# Altium footprint library WR-TBL_Pluggable PCB Header.PcbLib: 719 footprints (part 21 of 45)
Each footprint in its own frame and in the unit in brackets; x right, y up, seen from the top. Pads: shape width x height; smd on the part's side, far side on the other; paste and mask are expansions set on the pad; w line width, h text height; cw(c..) or ccw(c..) is an arc to the next point about the centre after c.
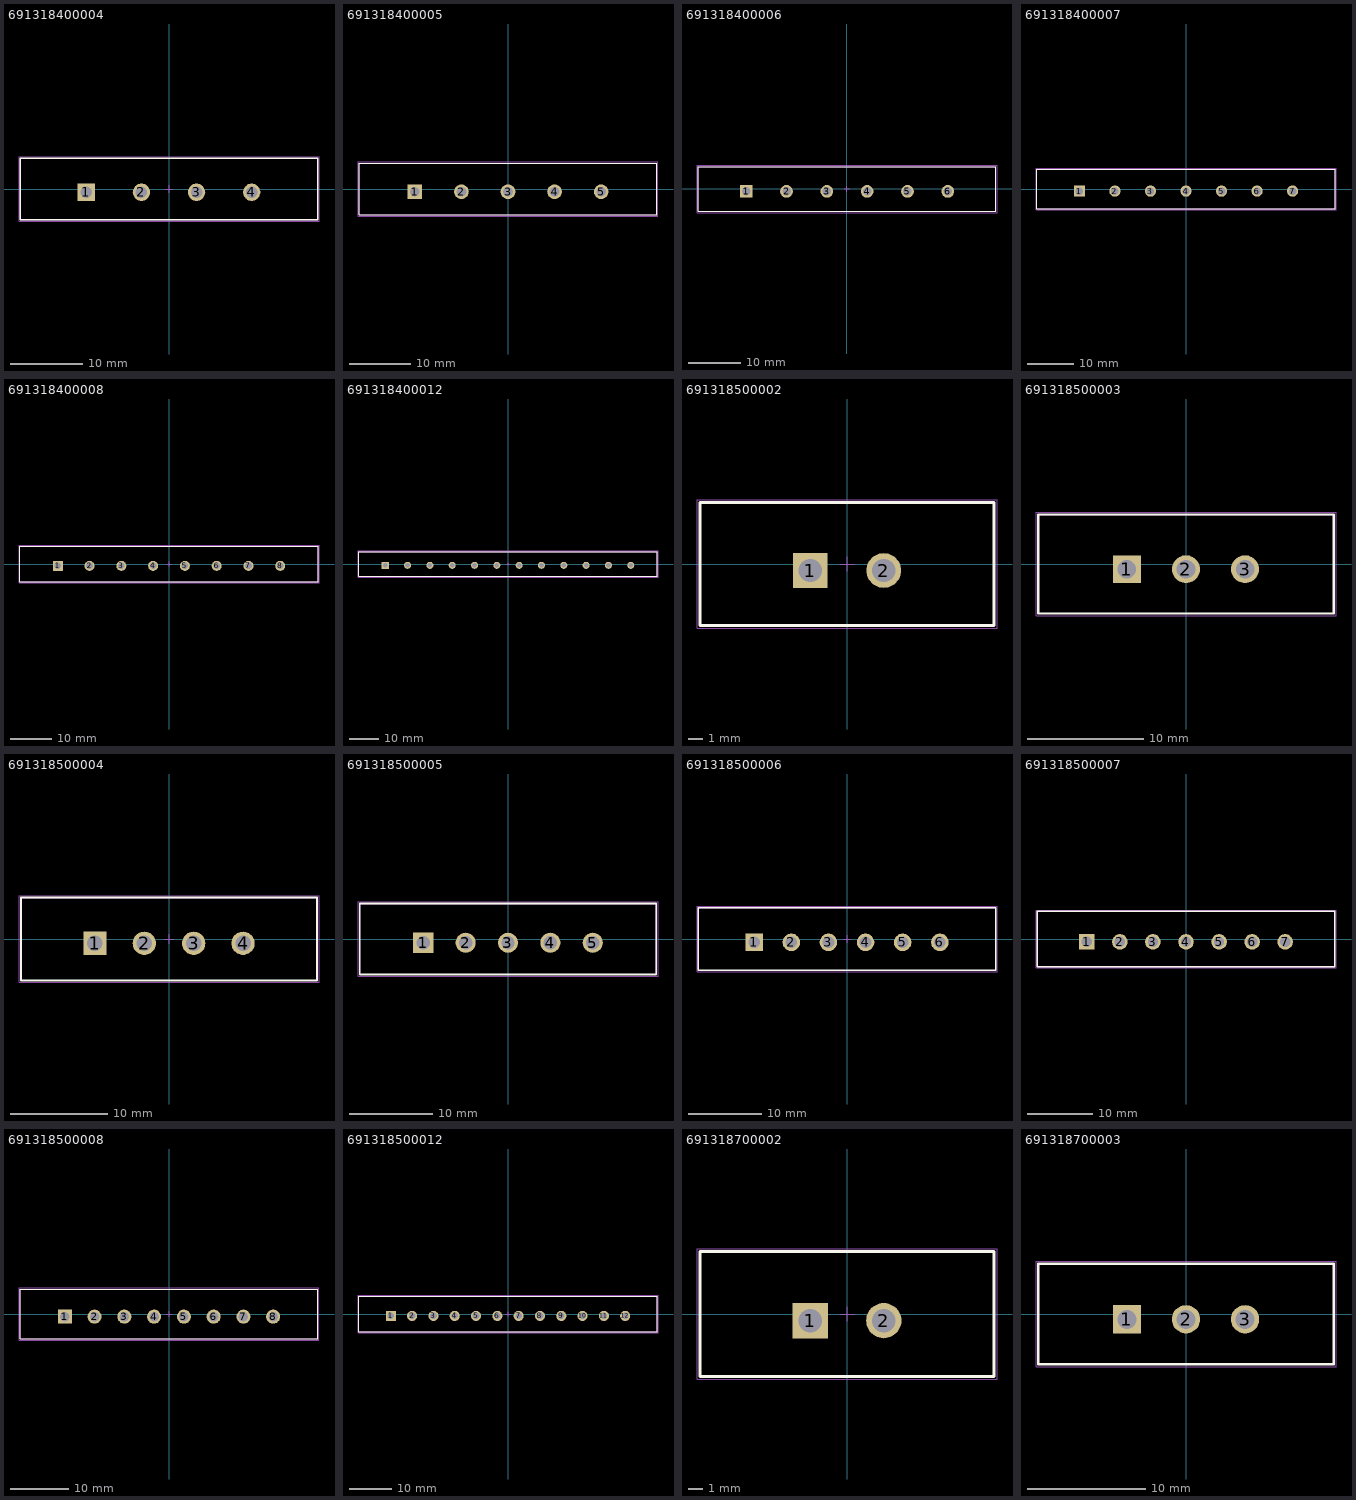
[diagram p20: the footprints below, top view; thin cyan lines are the x and y axes]

## 691318400004 [mm] "7.62 mm - Closed Vertical PCB Header with Flanges - 4p"
height 12
pads (4):
  rect 2.4x2.4 hole 1.6: 1(-11.43,-0.45)
  round 2.4 hole 1.6: 2(-3.81,-0.45) 3(3.81,-0.45) 4(11.43,-0.45)
Top Overlay:
  lines w0.2: -20.53,-4.25 -20.53,4.25 20.53,4.25 20.53,-4.25 -20.53,-4.25
Mechanical 13:
  lines w0.1: -20.53,-4.25 20.53,-4.25 20.53,4.25 -20.53,4.25 -20.53,-4.25
Mechanical 15:
  lines w0.05: -0.5,0 0.5,0 ; 0,-0.5 0,0.5 ; -20.73,-4.45 20.73,-4.45 20.73,4.45 -20.73,4.45 -20.73,-4.45
3D body "691318400004.stp": height 12.05, standoff -3.95, extent -20.53,-4.25 20.53,4.25

## 691318400005 [mm] "7.62 mm - Closed Vertical PCB Header with Flanges - 5p"
height 12
pads (5):
  rect 2.4x2.4 hole 1.6: 1(-15.24,-0.45)
  round 2.4 hole 1.6: 2(-7.62,-0.45) 3(0,-0.45) 4(7.62,-0.45) 5(15.24,-0.45)
Top Overlay:
  lines w0.2: -24.34,-4.25 24.34,-4.25 24.34,4.25 -24.34,4.25 -24.34,-4.25
Mechanical 13:
  lines w0.1: -24.34,-4.25 -24.34,4.25 24.34,4.25 24.34,-4.25 -24.34,-4.25
Mechanical 15:
  lines w0.05: -0.5,0 0.5,0 ; 0,-0.5 0,0.5 ; -24.54,-4.45 -24.54,4.45 24.54,4.45 24.54,-4.45 -24.54,-4.45
3D body "691318400005.stp": height 12.05, standoff -3.95, extent -24.34,-4.25 24.34,4.25

## 691318400006 [mm] "7.62 mm - Closed Vertical PCB Header with Flanges - 6p"
height 12
pads (6):
  rect 2.4x2.4 hole 1.6: 1(-19.05,-0.45)
  round 2.4 hole 1.6: 2(-11.43,-0.45) 3(-3.81,-0.45) 4(3.81,-0.45) 5(11.43,-0.45) 6(19.05,-0.45)
Top Overlay:
  lines w0.2: -28.15,-4.25 28.15,-4.25 28.15,4.25 -28.15,4.25 -28.15,-4.25
Mechanical 13:
  lines w0.1: -28.15,-4.25 -28.15,4.25 28.15,4.25 28.15,-4.25 -28.15,-4.25
Mechanical 15:
  lines w0.05: -0.5,0 0.5,0 ; 0,-0.5 0,0.5 ; -28.35,-4.45 -28.35,4.45 28.35,4.45 28.35,-4.45 -28.35,-4.45
3D body "691318400006.stp": height 12.05, standoff -3.95, extent -28.15,-4.25 28.15,4.25

## 691318400007 [mm] "7.62 mm - Closed Vertical PCB Header with Flanges - 7p"
height 12
pads (7):
  rect 2.4x2.4 hole 1.6: 1(-22.86,-0.45)
  round 2.4 hole 1.6: 2(-15.24,-0.45) 3(-7.62,-0.45) 4(0,-0.45) 5(7.62,-0.45) 6(15.24,-0.45) 7(22.86,-0.45)
Top Overlay:
  lines w0.2: -31.96,-4.25 31.96,-4.25 31.96,4.25 -31.96,4.25 -31.96,-4.25
Mechanical 13:
  lines w0.1: -31.96,-4.25 -31.96,4.25 31.96,4.25 31.96,-4.25 -31.96,-4.25
Mechanical 15:
  lines w0.05: -0.5,0 0.5,0 ; 0,-0.5 0,0.5 ; -32.16,-4.45 -32.16,4.45 32.16,4.45 32.16,-4.45 -32.16,-4.45
3D body "691318400007.stp": height 12.05, standoff -3.95, extent -31.96,-4.25 31.96,4.25

## 691318400008 [mm] "7.62 mm - Closed Vertical PCB Header with Flanges - 8p"
height 12
pads (8):
  rect 2.4x2.4 hole 1.6: 1(-26.67,-0.45)
  round 2.4 hole 1.6: 2(-19.05,-0.45) 3(-11.43,-0.45) 4(-3.81,-0.45) 5(3.81,-0.45) 6(11.43,-0.45) 7(19.05,-0.45) 8(26.67,-0.45)
Top Overlay:
  lines w0.2: -35.77,-4.25 35.77,-4.25 35.77,4.25 -35.77,4.25 -35.77,-4.25
Mechanical 13:
  lines w0.1: -35.77,-4.25 -35.77,4.25 35.77,4.25 35.77,-4.25 -35.77,-4.25
Mechanical 15:
  lines w0.05: -0.5,0 0.5,0 ; 0,-0.5 0,0.5 ; -35.97,-4.45 -35.97,4.45 35.97,4.45 35.97,-4.45 -35.97,-4.45
3D body "691318400008.stp": height 12.05, standoff -3.95, extent -35.77,-4.25 35.77,4.25

## 691318400012 [mm] "7.62 mm - Closed Vertical PCB Header with Flanges - 12p"
height 12
pads (12):
  rect 2.4x2.4 hole 1.6: 1(-41.91,-0.45)
  round 2.4 hole 1.6: 2(-34.29,-0.45) 3(-26.67,-0.45) 4(-19.05,-0.45) 5(-11.43,-0.45) 6(-3.81,-0.45) 7(3.81,-0.45) 8(11.43,-0.45) 9(19.05,-0.45) 10(26.67,-0.45) 11(34.29,-0.45) 12(41.91,-0.45)
Top Overlay:
  lines w0.2: -51.01,-4.25 51.01,-4.25 51.01,4.25 -51.01,4.25 -51.01,-4.25
Mechanical 13:
  lines w0.1: -51.01,-4.25 -51.01,4.25 51.01,4.25 51.01,-4.25 -51.01,-4.25
Mechanical 15:
  lines w0.05: -0.5,0 0.5,0 ; 0,-0.5 0,0.5 ; -51.21,-4.45 -51.21,4.45 51.21,4.45 51.21,-4.45 -51.21,-4.45
3D body "691318400012.stp": height 12.05, standoff -3.95, extent -51.01,-4.25 51.01,4.25

## 691318500002 [mm] "5,08mm - Closed Vertical PCB Header with Flanges - 02p"
height 12
pads (2):
  rect 2.4x2.4 hole 1.6: 1(-2.54,-0.45)
  round 2.4 hole 1.6: 2(2.54,-0.45)
Top Overlay:
  lines w0.2: -10.16,-4.25 -10.16,4.25 10.16,4.25 10.16,-4.25 -10.16,-4.25
Mechanical 13:
  lines w0.1: -10.16,-4.25 10.16,-4.25 10.16,4.25 -10.16,4.25 -10.16,-4.25
Mechanical 15:
  lines w0.05: -0.5,0 0.5,0 ; 0,-0.5 0,0.5 ; -10.36,-4.45 -10.36,4.45 10.36,4.45 10.36,-4.45 -10.36,-4.45
3D body "691318500002.stp": height 12.05, standoff -3.95, extent -10.16,-4.25 10.16,4.25

## 691318500003 [mm] "5,08mm - Closed Vertical PCB Header with Flanges - 03p"
height 12
pads (3):
  rect 2.4x2.4 hole 1.6: 1(-5.08,-0.45)
  round 2.4 hole 1.6: 2(0,-0.45) 3(5.08,-0.45)
Top Overlay:
  lines w0.2: -12.7,-4.25 -12.7,4.25 12.7,4.25 12.7,-4.25 -12.7,-4.25
Mechanical 13:
  lines w0.1: -12.7,-4.25 12.7,-4.25 12.7,4.25 -12.7,4.25 -12.7,-4.25
Mechanical 15:
  lines w0.05: -0.5,0 0.5,0 ; 0,-0.5 0,0.5 ; -12.9,-4.45 -12.9,4.45 12.9,4.45 12.9,-4.45 -12.9,-4.45
3D body "691318500003.stp": height 12.05, standoff -3.95, extent -12.7,-4.25 12.7,4.25

## 691318500004 [mm] "5,08mm - Closed Vertical PCB Header with Flanges - 04p"
height 12
pads (4):
  rect 2.4x2.4 hole 1.6: 1(-7.62,-0.45)
  round 2.4 hole 1.6: 2(-2.54,-0.45) 3(2.54,-0.45) 4(7.62,-0.45)
Top Overlay:
  lines w0.2: -15.24,-4.25 15.24,-4.25 15.24,4.25 -15.24,4.25 -15.24,-4.25
Mechanical 13:
  lines w0.1: -15.24,-4.25 -15.24,4.25 15.24,4.25 15.24,-4.25 -15.24,-4.25
Mechanical 15:
  lines w0.05: -0.5,0 0.5,0 ; 0,-0.5 0,0.5 ; -15.44,-4.45 15.44,-4.45 15.44,4.45 -15.44,4.45 -15.44,-4.45
3D body "691318500004.stp": height 12.05, standoff -3.95, extent -15.24,-4.25 15.24,4.25

## 691318500005 [mm] "5,08mm - Closed Vertical PCB Header with Flanges - 05p"
height 12
pads (5):
  rect 2.4x2.4 hole 1.6: 1(-10.16,-0.45)
  round 2.4 hole 1.6: 2(-5.08,-0.45) 3(0,-0.45) 4(5.08,-0.45) 5(10.16,-0.45)
Top Overlay:
  lines w0.2: -17.78,-4.25 17.78,-4.25 17.78,4.25 -17.78,4.25 -17.78,-4.25
Mechanical 13:
  lines w0.1: -17.78,-4.25 -17.78,4.25 17.78,4.25 17.78,-4.25 -17.78,-4.25
Mechanical 15:
  lines w0.05: -0.5,0 0.5,0 ; 0,-0.5 0,0.5 ; -17.98,-4.45 17.98,-4.45 17.98,4.45 -17.98,4.45 -17.98,-4.45
3D body "691318500005.stp": height 12.05, standoff -3.95, extent -17.78,-4.25 17.78,4.25

## 691318500006 [mm] "5,08mm - Closed Vertical PCB Header with Flanges - 06p"
height 12
pads (6):
  rect 2.4x2.4 hole 1.6: 1(-12.7,-0.45)
  round 2.4 hole 1.6: 2(-7.62,-0.45) 3(-2.54,-0.45) 4(2.54,-0.45) 5(7.62,-0.45) 6(12.7,-0.45)
Top Overlay:
  lines w0.2: -20.32,-4.25 20.32,-4.25 20.32,4.25 -20.32,4.25 -20.32,-4.25
Mechanical 13:
  lines w0.1: -20.32,-4.25 -20.32,4.25 20.32,4.25 20.32,-4.25 -20.32,-4.25
Mechanical 15:
  lines w0.05: -0.5,0 0.5,0 ; 0,-0.5 0,0.5 ; -20.52,-4.45 20.52,-4.45 20.52,4.45 -20.52,4.45 -20.52,-4.45
3D body "691318500006.stp": height 12.05, standoff -3.95, extent -20.32,-4.25 20.32,4.25

## 691318500007 [mm] "5,08mm - Closed Vertical PCB Header with Flanges - 07p"
height 12
pads (7):
  rect 2.4x2.4 hole 1.6: 1(-15.24,-0.45)
  round 2.4 hole 1.6: 2(-10.16,-0.45) 3(-5.08,-0.45) 4(0,-0.45) 5(5.08,-0.45) 6(10.16,-0.45) 7(15.24,-0.45)
Top Overlay:
  lines w0.2: -22.86,-4.25 22.86,-4.25 22.86,4.25 -22.86,4.25 -22.86,-4.25
Mechanical 13:
  lines w0.1: -22.86,-4.25 -22.86,4.25 22.86,4.25 22.86,-4.25 -22.86,-4.25
Mechanical 15:
  lines w0.05: -0.5,0 0.5,0 ; 0,-0.5 0,0.5 ; -23.06,-4.45 23.06,-4.45 23.06,4.45 -23.06,4.45 -23.06,-4.45
3D body "691318500007.stp": height 12.05, standoff -3.95, extent -22.86,-4.25 22.86,4.25

## 691318500008 [mm] "5,08mm - Closed Vertical PCB Header with Flanges - 08p"
height 12
pads (8):
  rect 2.4x2.4 hole 1.6: 1(-17.78,-0.45)
  round 2.4 hole 1.6: 2(-12.7,-0.45) 3(-7.62,-0.45) 4(-2.54,-0.45) 5(2.54,-0.45) 6(7.62,-0.45) 7(12.7,-0.45) 8(17.78,-0.45)
Top Overlay:
  lines w0.2: -25.4,-4.25 -25.4,4.25 25.4,4.25 25.4,-4.25 -25.4,-4.25
Mechanical 13:
  lines w0.1: -25.4,-4.25 25.4,-4.25 25.4,4.25 -25.4,4.25 -25.4,-4.25
Mechanical 15:
  lines w0.05: -0.5,0 0.5,0 ; 0,-0.5 0,0.5 ; -25.6,-4.45 -25.6,4.45 25.6,4.45 25.6,-4.45 -25.6,-4.45
3D body "691318500008.stp": height 12.05, standoff -3.95, extent -25.4,-4.25 25.4,4.25

## 691318500012 [mm] "5,08mm - Closed Vertical PCB Header with Flanges - 12p"
height 12
pads (12):
  rect 2.4x2.4 hole 1.6: 1(-27.94,-0.45)
  round 2.4 hole 1.6: 2(-22.86,-0.45) 3(-17.78,-0.45) 4(-12.7,-0.45) 5(-7.62,-0.45) 6(-2.54,-0.45) 7(2.54,-0.45) 8(7.62,-0.45) 9(12.7,-0.45) 10(17.78,-0.45) 11(22.86,-0.45) 12(27.94,-0.45)
Top Overlay:
  lines w0.2: -35.56,-4.25 35.56,-4.25 35.56,4.25 -35.56,4.25 -35.56,-4.25
Mechanical 13:
  lines w0.1: -35.56,-4.25 -35.56,4.25 35.56,4.25 35.56,-4.25 -35.56,-4.25
Mechanical 15:
  lines w0.05: -0.5,0 0.5,0 ; 0,-0.5 0,0.5 ; -35.76,-4.45 35.76,-4.45 35.76,4.45 -35.76,4.45 -35.76,-4.45
3D body "691318500012.stp": height 12.05, standoff -3.95, extent -35.56,-4.25 35.56,4.25

## 691318700002 [mm] "5.00mm - Closed Vertical PCB Header with Flanges - 02p"
height 12
pads (2):
  rect 2.4x2.4 hole 1.6: 1(-2.5,-0.45)
  round 2.4 hole 1.6: 2(2.5,-0.45)
Top Overlay:
  lines w0.2: -10,-4.25 -10,4.25 10,4.25 10,-4.25 -10,-4.25
Mechanical 13:
  lines w0.1: -10,-4.25 10,-4.25 10,4.25 -10,4.25 -10,-4.25
Mechanical 15:
  lines w0.05: -0.5,0 0.5,0 ; 0,-0.5 0,0.5 ; -10.2,-4.45 10.2,-4.45 10.2,4.45 -10.2,4.45 -10.2,-4.45
3D body "691318700002.stp": height 12.1, standoff -3.9, extent -10,-4.25 10,4.25

## 691318700003 [mm] "5.00mm - Closed Vertical PCB Header with Flanges - 03p"
height 12
pads (3):
  rect 2.4x2.4 hole 1.6: 1(-5,-0.45)
  round 2.4 hole 1.6: 2(0,-0.45) 3(5,-0.45)
Top Overlay:
  lines w0.2: -12.5,-4.25 -12.5,4.25 12.5,4.25 12.5,-4.25 -12.5,-4.25
Mechanical 13:
  lines w0.1: -12.5,-4.25 12.5,-4.25 12.5,4.25 -12.5,4.25 -12.5,-4.25
Mechanical 15:
  lines w0.05: -0.5,0 0.5,0 ; 0,-0.5 0,0.5 ; -12.7,-4.45 12.7,-4.45 12.7,4.45 -12.7,4.45 -12.7,-4.45
3D body "691318700003.stp": height 12.1, standoff -3.9, extent -12.5,-4.25 12.5,4.25